# Altium footprint library Footprints.PcbLib: 207 footprints (part 7 of 13)
Each footprint in its own frame and in the unit in brackets; x right, y up, seen from the top. Pads: shape width x height; smd on the part's side, far side on the other; paste and mask are expansions set on the pad; w line width, h text height; cw(c..) or ccw(c..) is an arc to the next point about the centre after c.
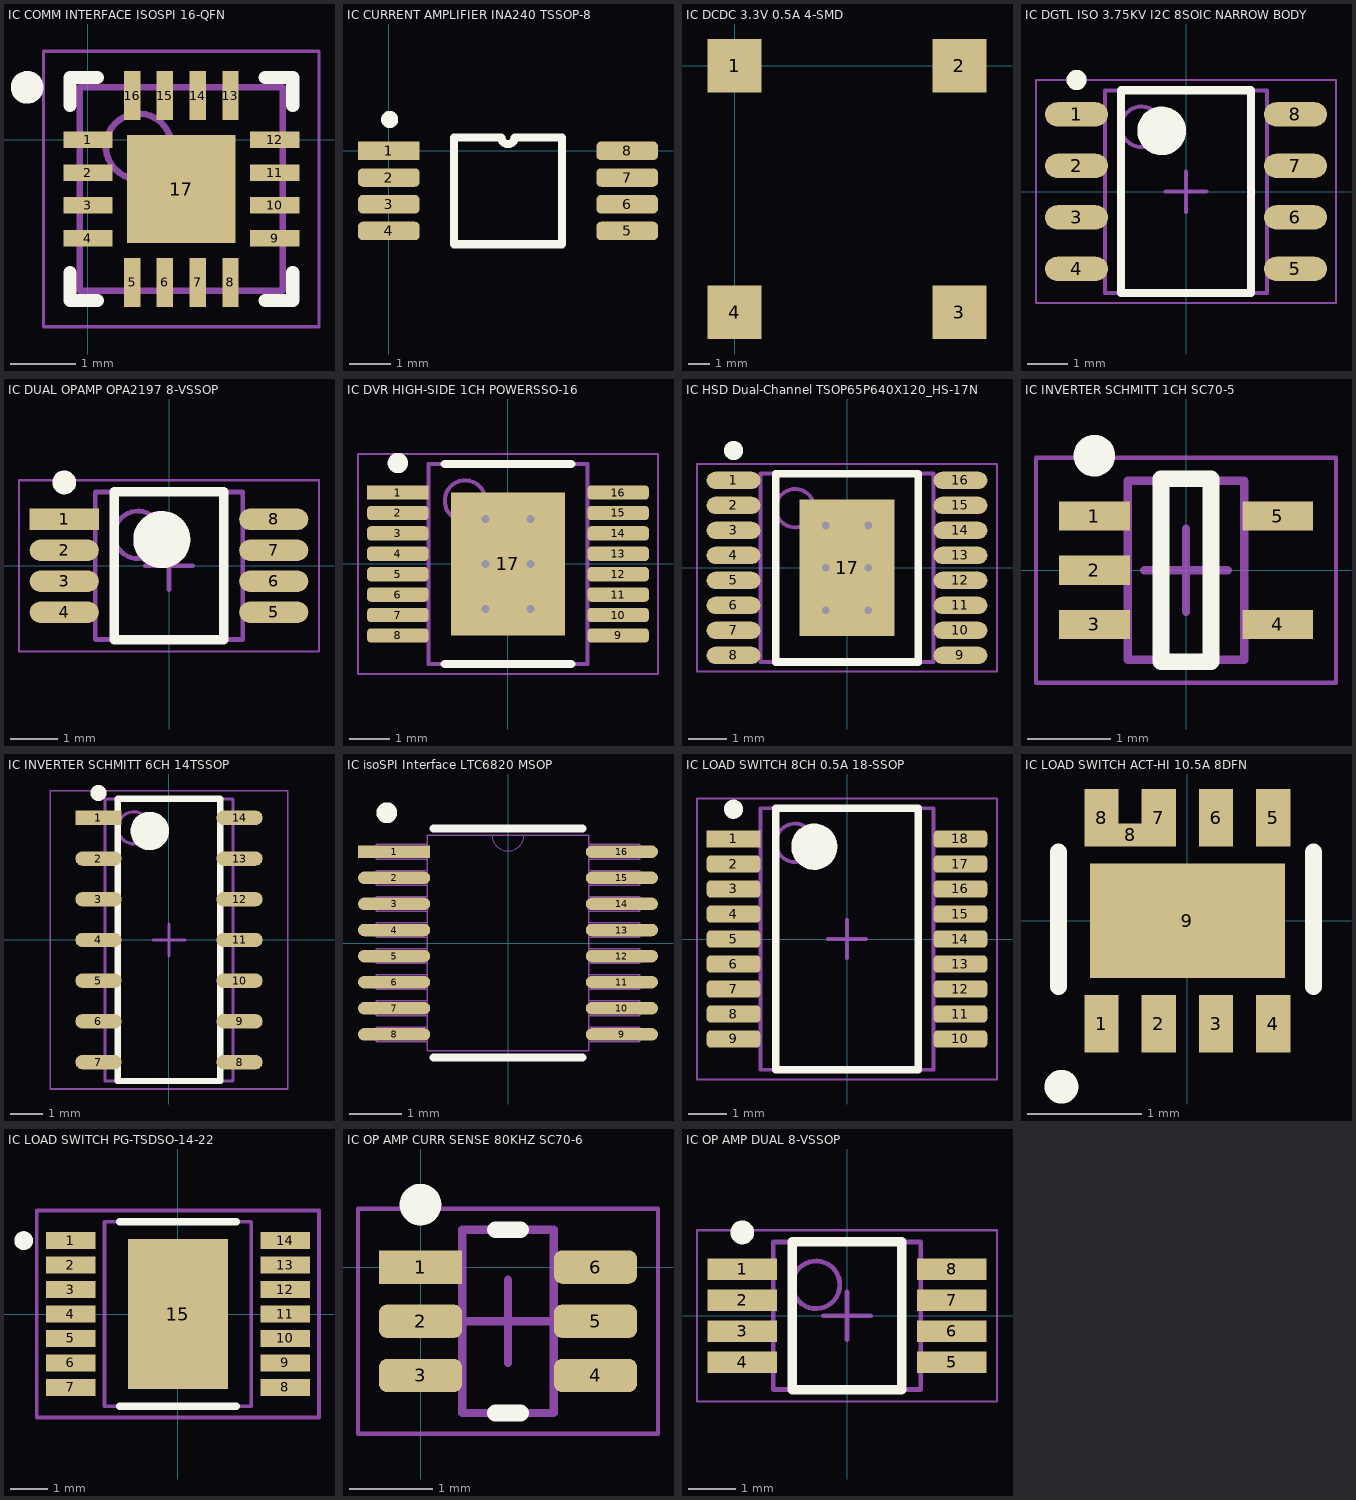
[diagram p6: the footprints below, top view; thin cyan lines are the x and y axes]

## IC COMM INTERFACE ISOSPI 16-QFN [mm] "16-WFQFN Exposed Pad"
height 0.8
pads (17):
  rect 0.75x0.25 smd: 1(0,0) 2(0,-0.5) 3(0,-1) 4(0,-1.5) 9(2.85,-1.5) 10(2.85,-1) 11(2.85,-0.5) 12(2.85,0)
  rect 0.25x0.75 smd: 5(0.675,-2.175) 6(1.175,-2.175) 7(1.675,-2.175) 8(2.175,-2.175) 13(2.175,0.675) 14(1.675,0.675) 15(1.175,0.675) 16(0.675,0.675)
  rect 1.65x1.65 smd: 17(1.425,-0.75)
Top Overlay:
  circle w0.25: c-0.925,0.8 r0.125
  lines w0.2: -0.275,-2.025 -0.275,-2.45 0.15,-2.45 ; -0.275,0.525 -0.275,0.95 0.15,0.95 ; 2.7,-2.45 3.125,-2.45 3.125,-2.025 ; 2.7,0.95 3.125,0.95 3.125,0.525
Mechanical 13:
  circle w0.1: c0.775,-0.1 r0.5
  lines w0.1: -0.125,-2.3 2.975,-2.3 2.975,0.8 -0.125,0.8 -0.125,-2.3
Mechanical 15:
  lines w0.05: -0.675,-2.85 3.525,-2.85 3.525,1.35 -0.675,1.35 -0.675,-2.85
  lines w0.1: 0.925,-0.75 1.925,-0.75 ; 1.425,-1.25 1.425,-0.25
3D body "IC COMM INTERFACE ISOSPI 16-QFN  .step": height 0.8, standoff 0, extent -0.175,-2.35 3.025,0.85

## IC CURRENT AMPLIFIER INA240 TSSOP-8 [mm]
pads (8):
  rect 1.5x0.45 smd: 1(0,0)
  rrect50% 1.5x0.45 smd: 2(0,-0.65) 3(0,-1.3) 4(0,-1.95) 5(5.8,-1.95) 6(5.8,-1.3) 7(5.8,-0.65) 8(5.8,0)
Top Overlay:
  lines w0.2: 1.585,-2.275 4.215,-2.275 4.215,0.325 3.062,0.325 cw(c2.9,0.325) 2.738,0.325 1.585,0.325 1.585,-2.275
  lines w0.254: 0.099,0.781 ccw(c0.021,0.762) 0.102,0.762
3D body "TSSOP-8.stp": height 1.2, standoff 0, extent -0.278,-2.515 6.222,0.585

## IC DCDC 3.3V 0.5A 4-SMD [mm] "ROF-78E3.3-0.5SMD-R"
height 4
pads (4):
  rect 2.5x2.5 smd: 1(0,0) 2(10.5,0) 3(10.5,-11.5) 4(0,-11.5)
3D body: height 4, standoff 0, extent -1,-12.5 11.5,1

## IC DGTL ISO 3.75KV I2C 8SOIC NARROW BODY [mm] "SOIC, 8-Leads, Body 4.90x3.90mm, Pitch 1.27mm, IPC Medium Density"
height 1.75
pads (8):
  oval 1.55x0.6 smd: 1(-2.7,1.905) 2(-2.7,0.635) 3(-2.7,-0.635) 4(-2.7,-1.905) 5(2.7,-1.905) 6(2.7,-0.635) 7(2.7,0.635) 8(2.7,1.905)
Top Overlay:
  circle w0.6: c-0.6,1.5 r0.3
  circle w0.25: c-2.7,2.755 r0.125
  lines w0.2: -1.6,-2.5 1.6,-2.5 1.6,2.5 -1.6,2.5 -1.6,-2.5
Mechanical 13:
  circle w0.1: c-1.1,1.6 r0.5
  lines w0.1: -2,-2.5 2,-2.5 2,2.5 -2,2.5 -2,-2.5
Mechanical 15:
  lines w0.05: -3.7,-2.75 3.7,-2.75 3.7,2.75 -3.7,2.75 -3.7,-2.75
  lines w0.1: -0.5,0 0.5,0 ; 0,-0.5 0,0.5
3D body "IC DGTL ISO 3.75KV I2C 8SOIC NARROW BODY.step": height 1.75, standoff 0, extent -3,-2.5 3,2.5

## IC DUAL OPAMP OPA2197 8-VSSOP [mm] "TSOP, 8-Leads, Body 3.00x3.00mm, Pitch 0.65mm, IPC Medium Density"
height 1.1
pads (8):
  rect 1.45x0.45 smd: 1(-2.2,0.975)
  oval 1.45x0.45 smd: 2(-2.2,0.325) 3(-2.2,-0.325) 4(-2.2,-0.975) 5(2.2,-0.975) 6(2.2,-0.325) 7(2.2,0.325) 8(2.2,0.975)
Top Overlay:
  circle w0.25: c-2.2,1.75 r0.125
  circle w0.6: c-0.15,0.55 r0.3
  lines w0.2: -1.15,-1.55 -1.15,1.55 1.15,1.55 1.15,-1.55 -1.15,-1.55
Assembly Top:
  circle w0.1: c-0.65,0.65 r0.5
  lines w0.1: -1.55,-1.55 -1.55,1.55 1.55,1.55 1.55,-1.55 -1.55,-1.55
Courtyard Top:
  lines w0.05: -3.15,-1.8 -3.15,1.8 3.15,1.8 3.15,-1.8 -3.15,-1.8
  lines w0.1: -0.5,0 0.5,0 ; 0,-0.5 0,0.5
3D body "IC DUAL OPAMP OPA2197 8-VSSOP.step": height 1.1, standoff 0, extent -2.45,-1.55 2.45,1.55

## IC DVR HIGH-SIDE 1CH POWERSSO-16 [mm] "SSOP, 16-Leads, Body 4.90x3.90mm, Pitch 0.50mm, Thermal Pad 3.50x2.80mm, IPC Medium Density"
height 1.7
pads (17):
  rect 1.5x0.35 smd: 1(-2.7,1.75)
  rrect50% 1.5x0.35 smd: 2(-2.7,1.25) 3(-2.7,0.75) 4(-2.7,0.25) 5(-2.7,-0.25) 6(-2.7,-0.75) 7(-2.7,-1.25) 8(-2.7,-1.75) 9(2.7,-1.75) 10(2.7,-1.25) 11(2.7,-0.75) 12(2.7,-0.25) 13(2.7,0.25) 14(2.7,0.75) 15(2.7,1.25) 16(2.7,1.75)
  rect 2.8x3.5 smd: 17(0,0)
via -0.55,1.1 diameter 0.5 hole 0.2
via 0.55,1.1 diameter 0.5 hole 0.2
via -0.55,0 diameter 0.5 hole 0.2
via 0.55,0 diameter 0.5 hole 0.2
via -0.55,-1.1 diameter 0.5 hole 0.2
via 0.55,-1.1 diameter 0.5 hole 0.2
Top Overlay:
  circle w0.25: c-2.7,2.475 r0.125
  lines w0.2: -1.55,-2.45 1.55,-2.45 ; -1.55,2.45 1.55,2.45
Mechanical 13:
  circle w0.1: c-1.05,1.55 r0.5
  lines w0.1: -1.95,-2.45 -1.95,2.45 1.95,2.45 1.95,-2.45 -1.95,-2.45
Mechanical 15:
  lines w0.05: -3.675,-2.7 -3.675,2.7 3.675,2.7 3.675,-2.7 -3.675,-2.7
  lines w0.1: -0.5,0 0.5,0 ; 0,-0.5 0,0.5
3D body "IC DVR HIGH-SIDE 1CH POWERSSO-16.step": height 1.7, standoff 0, extent -3,-2.45 3,2.45

## IC HSD Dual-Channel TSOP65P640X120_HS-17N [mm] "TSOP, 16-Leads, Body 5.00x4.40mm, Pitch 0.65mm, Thermal Pad 3.55x2.46mm, IPC Medium Density"
height 1.2
pads (17):
  oval 1.4x0.45 smd: 1(-2.95,2.275) 2(-2.95,1.625) 3(-2.95,0.975) 4(-2.95,0.325) 5(-2.95,-0.325) 6(-2.95,-0.975) 7(-2.95,-1.625) 8(-2.95,-2.275) 9(2.95,-2.275) 10(2.95,-1.625) 11(2.95,-0.975) 12(2.95,-0.325) 13(2.95,0.325) 14(2.95,0.975) 15(2.95,1.625) 16(2.95,2.275)
  rect 2.46x3.55 smd: 17(0,0)
via -0.55,1.1 diameter 0.5 hole 0.2
via 0.55,1.1 diameter 0.5 hole 0.2
via -0.55,0 diameter 0.5 hole 0.2
via 0.55,0 diameter 0.5 hole 0.2
via -0.55,-1.1 diameter 0.5 hole 0.2
via 0.55,-1.1 diameter 0.5 hole 0.2
Top Overlay:
  circle w0.25: c-2.95,3.05 r0.125
  lines w0.2: -1.85,-2.45 -1.85,2.45 1.85,2.45 1.85,-2.45 -1.85,-2.45
Mechanical 13:
  circle w0.1: c-1.35,1.55 r0.5
  lines w0.1: -2.25,-2.45 -2.25,2.45 2.25,2.45 2.25,-2.45 -2.25,-2.45
Mechanical 15:
  lines w0.05: -3.9,-2.7 -3.9,2.7 3.9,2.7 3.9,-2.7 -3.9,-2.7
  lines w0.1: -0.5,0 0.5,0 ; 0,-0.5 0,0.5
3D body "TSOP65P640X120_HS-17N.step": height 1.2, standoff 0, extent -3.2,-2.45 3.2,2.45

## IC INVERTER SCHMITT 1CH SC70-5 [mm] "Inverter IC 1 Channel Schmitt Trigger SC-70-5"
height 1.1
pads (5):
  rect 0.85x0.35 smd: 1(-1.1,0.65) 2(-1.1,0) 3(-1.1,-0.65) 4(1.1,-0.65) 5(1.1,0.65)
Top Overlay:
  circle w0.25: c-1.1,1.375 r0.125
  lines w0.2: -0.3,-1.1 0.3,-1.1 0.3,1.1 -0.3,1.1 -0.3,-1.1
Assembly Top:
  lines w0.1: -0.7,-1.075 -0.7,1.075 0.7,1.075 0.7,-1.075 -0.7,-1.075
Courtyard Top:
  lines w0.05: -1.8,-1.35 -1.8,1.35 1.8,1.35 1.8,-1.35 -1.8,-1.35
  lines w0.1: -0.5,0 0.5,0 ; 0,-0.5 0,0.5
3D body "IC INVERTER SCHMITT 1CH SC70-5.step": height 1.1, standoff 0, extent -1.2,-1.075 1.2,1.075

## IC INVERTER SCHMITT 2CH 6-TSSOP [mm]

## IC INVERTER SCHMITT 6CH 14TSSOP [mm]
height 1.75
pads (14):
  rect 1.45x0.45 smd: 1(-2.2,3.81)
  oval 1.45x0.45 smd: 2(-2.2,2.54) 3(-2.2,1.27) 4(-2.2,0) 5(-2.2,-1.27) 6(-2.2,-2.54) 7(-2.2,-3.81) 8(2.2,-3.81) 9(2.2,-2.54) 10(2.2,-1.27) 11(2.2,0) 12(2.2,1.27) 13(2.2,2.54) 14(2.2,3.81)
Top Overlay:
  circle w0.25: c-2.2,4.585 r0.125
  circle w0.6: c-0.6,3.4 r0.3
  lines w0.2: -1.6,-4.4 -1.6,4.4 1.6,4.4 1.6,-4.4 -1.6,-4.4
Assembly Top:
  circle w0.1: c-1.1,3.5 r0.5
  lines w0.1: -2,-4.4 -2,4.4 2,4.4 2,-4.4 -2,-4.4
Courtyard Top:
  lines w0.05: -3.7,-4.65 -3.7,4.65 3.7,4.65 3.7,-4.65 -3.7,-4.65
  lines w0.1: -0.5,0 0.5,0 ; 0,-0.5 0,0.5
3D body "SOP127P600-8N.step": height 1.75, standoff 0, extent -3,-4.4 3,4.4

## IC isoSPI Interface LTC6820 MSOP [mil]
height 43.31
pads (16):
  rect 54.56x9.43 smd paste+0 mask+0: 1(-86,68.95)
  oval 54.56x9.43 smd paste+0 mask+0: 2(-86,49.25) 3(-86,29.55) 4(-86,9.85) 5(-86,-9.85) 6(-86,-29.55) 7(-86,-49.25) 8(-86,-68.95) 9(86,-68.95) 10(86,-49.25) 11(86,-29.55) 12(86,-9.85) 13(86,9.85) 14(86,29.55) 15(86,49.25) 16(86,68.95)
Top Overlay:
  circle w7.87: c-91.54,98.43 r3.94
  lines w6: -56.11,-86.5 56.11,-86.5 ; -56.11,86.5 56.11,86.5
Mechanical 13:
  lines w0: -12,81.5 ccw(c0,81.5) 12,81.5
  lines w1: -99.5,-74.45 -61,-74.45 -61,-63.45 -99.5,-63.45 -99.5,-74.45 ; -99.5,-54.75 -61,-54.75 -61,-43.75 -99.5,-43.75 -99.5,-54.75 ; -99.5,-35.05 -61,-35.05 -61,-24.05 -99.5,-24.05 -99.5,-35.05 ; -99.5,-15.35 -61,-15.35 -61,-4.35 -99.5,-4.35 -99.5,-15.35 ; -99.5,4.35 -61,4.35 -61,15.35 -99.5,15.35 -99.5,4.35 ; -99.5,24.05 -61,24.05 -61,35.05 -99.5,35.05 -99.5,24.05 ; -99.5,43.75 -61,43.75 -61,54.75 -99.5,54.75 -99.5,43.75 ; -99.5,63.45 -61,63.45 -61,74.45 -99.5,74.45 -99.5,63.45 ; -61,-81.5 -61,81.5 61,81.5 61,-81.5 -61,-81.5 ; 61,-74.45 99.5,-74.45 99.5,-63.45 61,-63.45 61,-74.45 ; 61,-54.75 99.5,-54.75 99.5,-43.75 61,-43.75 61,-54.75 ; 61,-35.05 99.5,-35.05 99.5,-24.05 61,-24.05 61,-35.05 ; 61,-15.35 99.5,-15.35 99.5,-4.35 61,-4.35 61,-15.35 ; 61,4.35 99.5,4.35 99.5,15.35 61,15.35 61,4.35 ; 61,24.05 99.5,24.05 99.5,35.05 61,35.05 61,24.05 ; 61,43.75 99.5,43.75 99.5,54.75 61,54.75 61,43.75 ; 61,63.45 99.5,63.45 99.5,74.45 61,74.45 61,63.45

## IC LOAD SWITCH 8CH 0.5A 18-SSOP [mm] "TSOP, 18-Leads, Body 6.70x4.40mm, Pitch 0.65mm, IPC Medium Density"
height 1.55
pads (18):
  rect 1.4x0.45 smd: 1(-2.95,2.6)
  rrect50% 1.4x0.45 smd: 2(-2.95,1.95) 3(-2.95,1.3) 4(-2.95,0.65) 5(-2.95,0) 6(-2.95,-0.65) 7(-2.95,-1.3) 8(-2.95,-1.95) 9(-2.95,-2.6) 10(2.95,-2.6) 11(2.95,-1.95) 12(2.95,-1.3) 13(2.95,-0.65) 14(2.95,0) 15(2.95,0.65) 16(2.95,1.3) 17(2.95,1.95) 18(2.95,2.6)
Top Overlay:
  circle w0.25: c-2.95,3.375 r0.125
  circle w0.6: c-0.85,2.4 r0.3
  lines w0.2: -1.85,-3.4 -1.85,3.4 1.85,3.4 1.85,-3.4 -1.85,-3.4
Assembly Top:
  circle w0.1: c-1.35,2.5 r0.5
  lines w0.1: -2.25,-3.4 -2.25,3.4 2.25,3.4 2.25,-3.4 -2.25,-3.4
Courtyard Top:
  lines w0.05: -3.9,-3.65 -3.9,3.65 3.9,3.65 3.9,-3.65 -3.9,-3.65
  lines w0.1: -0.5,0 0.5,0 ; 0,-0.5 0,0.5
3D body "IC LOAD SWITCH 8CH 0.5A 18-SSOP.step": height 1.55, standoff 0, extent -3.2,-3.4 3.2,3.4

## IC LOAD SWITCH ACT-HI 10.5A 8DFN [mm]
pads (10):
  rect 0.3x0.5 smd: 1(-0.75,-0.9) 2(-0.25,-0.9) 3(0.25,-0.9) 4(0.75,-0.9) 5(0.75,0.9) 6(0.25,0.9) 7(-0.25,0.9) 8(-0.75,0.9)
  rect 0.8x0.2 smd paste+0 mask+0: 8(-0.5,0.75)
  rect 1.7x1 smd: 9(0,0)
Top Overlay:
  circle w0.254: c-1.1,-1.45 r0.02
  lines w0.15: -1.125,-0.575 -1.125,0.6 ; 1.1,-0.575 1.1,0.6
3D body "QFN50P200X200X100_HS-9N.step": height 1, standoff 0, extent -1,-1.05 1,1.05

## IC LOAD SWITCH PG-TSDSO-14-22 [mm] "SOP,0.65mm pitch;14 pin,3.90mm W X 4.90mm L X 1.15mm H body (w/thermal tab)"
height 1.15
pads (15):
  rect 1.31x0.45 smd paste+0 mask+0: 1(-2.85,1.95) 2(-2.85,1.3) 3(-2.85,0.65) 4(-2.85,0) 5(-2.85,-0.65) 6(-2.85,-1.3) 7(-2.85,-1.95) 8(2.85,-1.95) 9(2.85,-1.3) 10(2.85,-0.65) 11(2.85,0) 12(2.85,0.65) 13(2.85,1.3) 14(2.85,1.95)
  rect 2.65x4 smd paste-2.65 mask+0: 15(0,0)
Top Overlay:
  circle w0.25: c-4.1,1.95 r0.125
  lines w0.2: -1.55,-2.45 1.55,-2.45 ; -1.55,2.45 1.55,2.45
Top Paste:
  region: -1.325,-2 1.325,-2 1.325,-0.15 -1.325,-0.15
  region: 1.325,2 -1.325,2 -1.325,0.15 1.325,0.15
Mechanical 13:
  lines w0.1: -1.95,-2.45 -1.95,2.45 1.95,2.45 1.95,-2.45 -1.95,-2.45
Mechanical 15:
  lines w0.1: -0.5,0 0.5,0 ; 0,-0.5 0,0.5 ; -3.75,-2.75 -3.75,2.75 3.75,2.75 3.75,-2.75 -3.75,-2.75
3D body "PG-TSDSO-14-22.stp": height 1.16, standoff 0, extent -3,-2.45 3,2.45

## IC OP AMP CURR SENSE 80KHZ SC70-6 [mm]
height 1.1
pads (6):
  rect 1x0.4 smd: 1(0,0)
  rrect50% 1x0.4 smd: 2(0,-0.65) 3(0,-1.3) 4(2.1,-1.3) 5(2.1,-0.65) 6(2.1,0)
Top Overlay:
  circle w0.25: c0,0.75 r0.125
  lines w0.2: 0.9,-1.75 1.2,-1.75 ; 0.9,0.45 1.2,0.45
Mechanical 13:
  lines w0.1: 0.5,-1.75 0.5,0.45 1.6,0.45 1.6,-1.75 0.5,-1.75
Mechanical 15:
  lines w0.05: -0.75,-2 -0.75,0.7 2.85,0.7 2.85,-2 -0.75,-2
  lines w0.1: 0.55,-0.65 1.55,-0.65 ; 1.05,-1.15 1.05,-0.15
3D body "IC OP AMP CURR SENSE 80KHZ SC70-6.step": height 1.1, standoff 0, extent 0,-1.75 2.1,0.45

## IC OP AMP DUAL 8-VSSOP [mm] "VSSOP 8-Leads, Body 3.00x3.00mm, Pitch 0.65mm, IPC Medium Density"
height 1.1
pads (8):
  rect 1.45x0.45 smd: 1(-2.2,0.975) 2(-2.2,0.325) 3(-2.2,-0.325) 4(-2.2,-0.975) 5(2.2,-0.975) 6(2.2,-0.325) 7(2.2,0.325) 8(2.2,0.975)
Top Overlay:
  circle w0.25: c-2.2,1.75 r0.125
  lines w0.2: -1.15,-1.55 1.15,-1.55 1.15,1.55 -1.15,1.55 -1.15,-1.55
Mechanical 13:
  circle w0.1: c-0.65,0.65 r0.5
  lines w0.1: -1.55,-1.55 1.55,-1.55 1.55,1.55 -1.55,1.55 -1.55,-1.55
Mechanical 15:
  lines w0.05: -3.15,-1.8 3.15,-1.8 3.15,1.8 -3.15,1.8 -3.15,-1.8
  lines w0.1: -0.5,0 0.5,0 ; 0,-0.5 0,0.5
3D body: height 1.1, standoff 0.05, extent -1.55,-1.55 1.55,1.55